# Altium footprint library lib_protel_HC.PCBLIB: 724 footprints (part 22 of 46)
Each footprint in its own frame and in the unit in brackets; x right, y up, seen from the top. Pads: shape width x height; smd on the part's side, far side on the other; paste and mask are expansions set on the pad; w line width, h text height; cw(c..) or ccw(c..) is an arc to the next point about the centre after c.
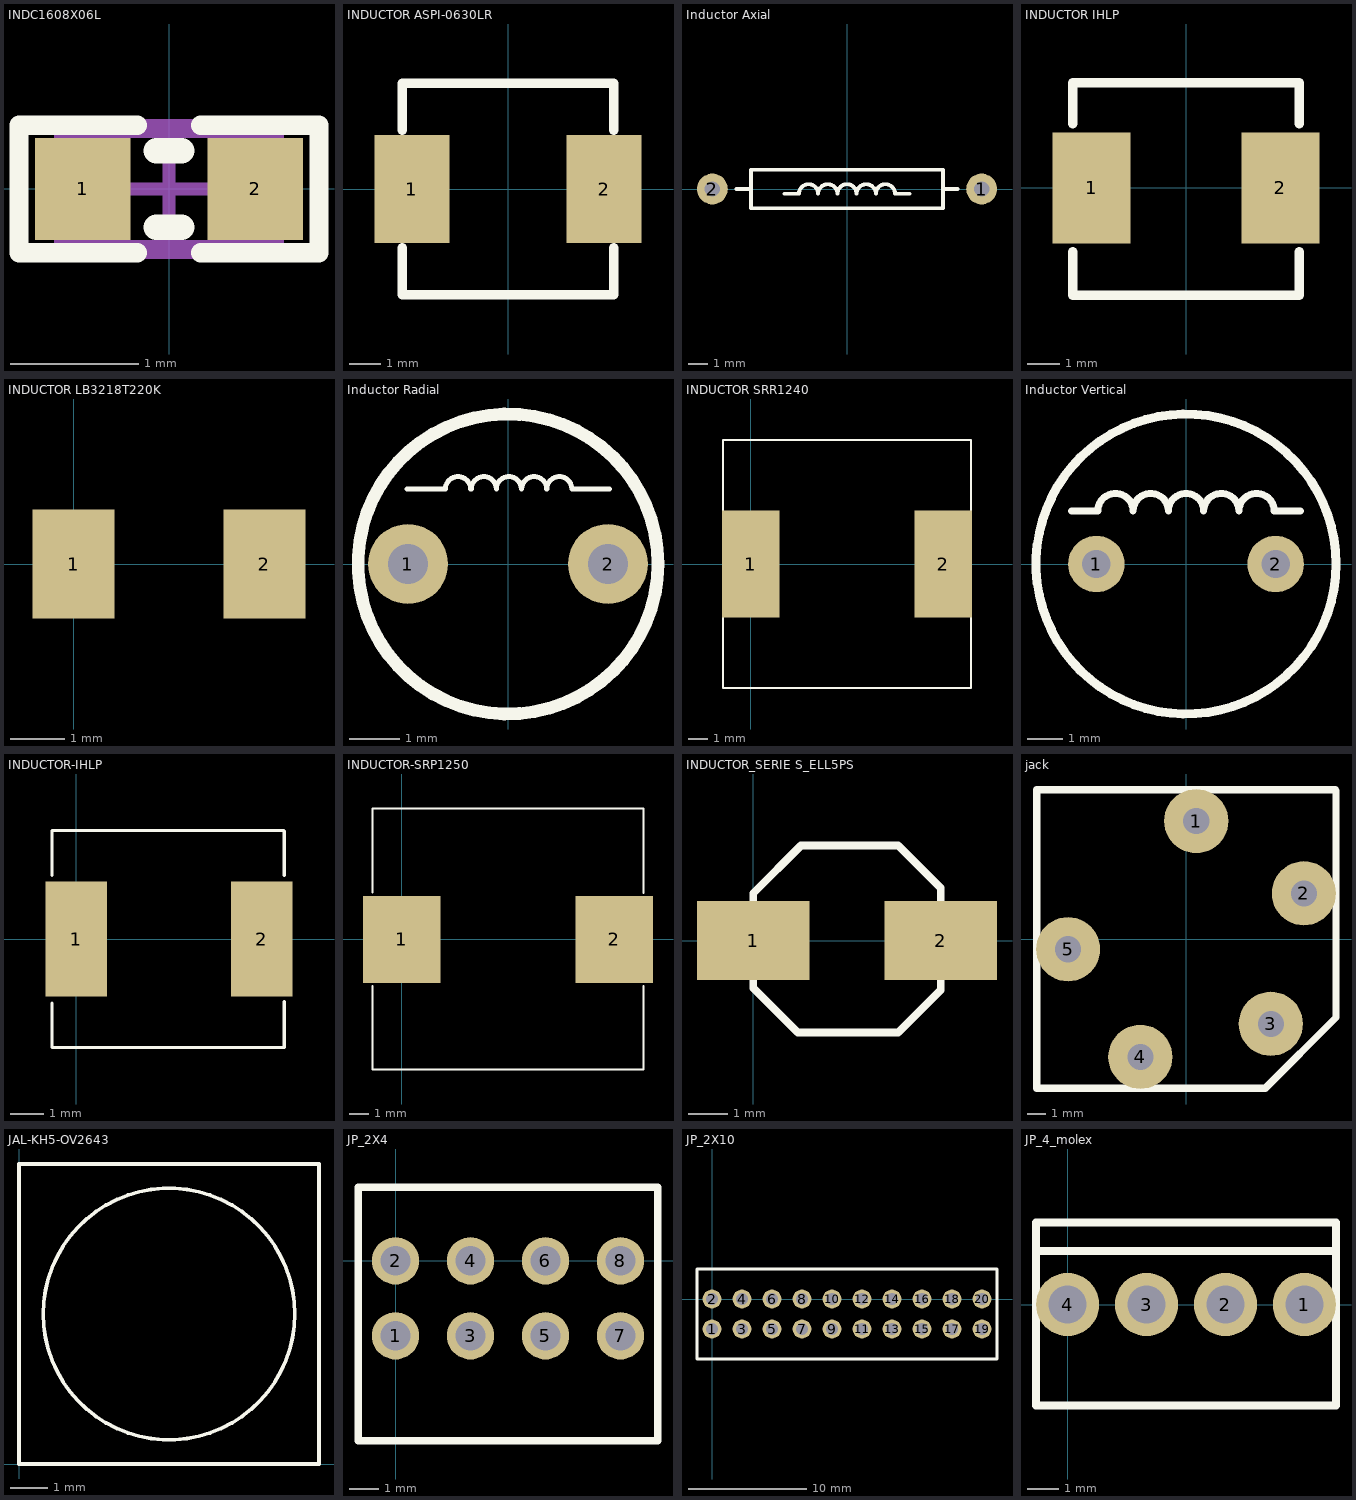
[diagram p21: the footprints below, top view; thin cyan lines are the x and y axes]

## INDC1608X06L [mm]
pads (2):
  rect 0.75x0.8 smd: 1(-0.675,0) 2(0.675,0)
Top Overlay:
  lines w0.152: -0.25,-0.5 -1.175,-0.5 -1.175,0.5 -0.25,0.5 ; 0.25,-0.5 1.175,-0.5 1.175,0.5 0.25,0.5
  lines w0.2: -0.1,-0.3 0.1,-0.3 ; -0.1,0.3 0.1,0.3
Mechanical 13:
  lines w0.1: -0.85,-0.45 0.85,-0.45 0.85,0.45 -0.85,0.45 -0.85,-0.45
Mechanical 15:
  lines w0.1: -0.45,0 0.45,0 ; 0,-0.45 0,0.45 ; -1.175,-0.5 -1.175,0.5 1.175,0.5 1.175,-0.5 -1.175,-0.5
3D body: height 0.8, standoff 0, extent -0.8,-0.475 0.8,0.475

## INDUCTOR ASPI-0630LR [mm]
height 3
pads (2):
  rect 2.35x3.4 smd: 1(-3.025,0) 2(3.025,0)
Top Overlay:
  lines w0.3: -3.325,-1.85 -3.325,-3.325 3.325,-3.325 3.325,-1.85 ; -3.325,1.85 -3.325,3.325 3.325,3.325 3.325,1.85
3D body "ASPI-0630LR.STEP": height 3, standoff 0, extent -3.6,-3.325 3.6,3.325

## Inductor Axial [mm]
pads (2):
  round 1.6 hole 0.8: 1(7,0) 2(-7,0)
Top Overlay:
  lines w0.2: -5.75,0 -5,0 ; -3.25,-0.25 -2.5,-0.25 cw(c-2,-0.25) -1.5,-0.25 cw(c-1,-0.25) -0.5,-0.25 cw(c0,-0.25) 0.5,-0.25 cw(c1,-0.25) 1.5,-0.25 cw(c2,-0.25) 2.5,-0.25 3.25,-0.25 ; 5,0 5.75,0 ; -5,-1 -5,1 5,1 5,-1 -5,-1

## INDUCTOR IHLP [mm] "IHLP-2525CZ-01"
pads (2):
  rect 2.41x3.43 smd: 1(-2.92,0) 2(2.92,0)
Top Overlay:
  lines w0.3: -3.5,-1.975 -3.5,-3.325 3.5,-3.325 3.5,-1.975 ; -3.5,1.975 -3.5,3.25 3.5,3.25 3.5,1.975
3D body "IHLP-2525CZ.STEP": height 3, standoff 0, extent -3.405,-3.295 3.455,3.175

## INDUCTOR LB3218T220K [mm] "LB3218T220K"
height 1.8
pads (2):
  rect 1.5x2 smd: 1(0,0) 2(3.5,0)

## Inductor Radial [mm] "Pin Power Inductor"
height 5
pads (2):
  round 1.6 hole 0.8: 1(-2,0) 2(2,0)
Top Overlay:
  circle w0.254: c0,0 r3
  lines w0.1: -2.022,1.5 -1.272,1.5 ; -1.25,1.5 cw(c-1,1.5) -0.75,1.5 ; -0.732,1.5 cw(c-0.482,1.5) -0.232,1.5 cw(c0.017,1.5) 0.267,1.5 ; 0.272,1.5 cw(c0.522,1.5) 0.772,1.5 ; 0.777,1.5 cw(c1.027,1.5) 1.277,1.5 ; 1.28,1.5 2.03,1.5
3D body "1.STEP": height 2.9, standoff 0, extent -3.407,-2.357 3.393,2.343

## INDUCTOR SRR1240 [mm] "INDUCTOR"
height 4
pads (2):
  rect 2.9x5.4 smd: 1(0,0) 2(9.7,0)
Top Overlay:
  lines w0.1: -1.4,-6.25 -1.4,0 -1.4,6.25 11.1,6.25 11.1,-6.25 -1.4,-6.25

## Inductor Vertical [mm]
pads (2):
  round 1.6 hole 0.8: 1(-2.54,0) 2(2.54,0)
Top Overlay:
  circle w0.254: c0,0 r4.25
  lines w0.2: -3.25,1.5 -2.5,1.5 cw(c-2,1.5) -1.5,1.5 cw(c-1,1.5) -0.5,1.5 cw(c0,1.5) 0.5,1.5 cw(c1,1.5) 1.5,1.5 cw(c2,1.5) 2.5,1.5 3.25,1.5

## INDUCTOR-IHLP [mm] "IHLP-2525CZ-01"
height 3
pads (2):
  rect 1.83x3.43 smd: 1(0,0) 2(5.55,0)
Top Overlay:
  lines w0.1: -0.725,-1.925 -0.725,-3.25 0,-3.25 5.55,-3.25 6.225,-3.25 6.225,-1.875 ; -0.725,1.9 -0.725,3.25 0,3.25 5.5,3.25 6.2,3.25 6.225,3.225 6.225,1.9

## INDUCTOR-SRP1250 [mm] "SRP1250-4R7M"
height 5.2
pads (2):
  rect 4x4.5 smd: 1(0,0) 2(11,0)
Top Overlay:
  lines w0.1: -1.5,-2.4 -1.5,-6.725 12.5,-6.725 12.5,-2.4 ; -1.5,2.425 -1.5,6.775 12.5,6.775 12.5,2.4

## INDUCTOR_SERIE S_ELL5PS [mm]
height 1.8
pads (2):
  rect 2.85x2 smd: 1(0,0) 2(4.75,0)
Top Overlay:
  lines w0.2: 0,-1.2 1.13,-2.33 3.67,-2.33 4.75,-1.25 4.75,1.33 3.67,2.41 1.21,2.41 0,1.2 0,-1.2

## jack [mil]
pads (5):
  round 137.8 hole 56: 1(22,253) 2(253,98) 3(182,-182) 4(-98,-253) 5(-253,-22)
Top Overlay:
  lines w15.75: 320,320 -320,320 -320,-320 170.16,-320 321.85,-168.31 321.85,318.15

## JAL-KH5-OV2643 [mm] "CAMARA OV"
height 4.7
Top Overlay:
  circle w0.1: c4,4 r3.355
  lines w0.1: 0,0 8,0 8,8 0,8 0,0

## JP_2X4 [mm]
height 10
pads (8):
  round 1.6 hole 1: 1(0,-2.54) 2(0,0) 3(2.54,-2.54) 4(2.54,0) 5(5.08,-2.54) 6(5.08,0) 7(7.62,-2.54) 8(7.62,0)
Top Overlay:
  lines w0.254: -1.27,-6.1 8.89,-6.1 8.89,2.5 -1.27,2.5 -1.27,-6.1

## JP_2X10 [mm] "PASO 2.54mm"
height 11.4
pads (20):
  round 1.6 hole 1: 1(0,-2.54) 2(0,0) 3(2.54,-2.54) 4(2.54,0) 5(5.08,-2.54) 6(5.08,0) 7(7.62,-2.54) 8(7.62,0) 9(10.16,-2.54) 10(10.16,0) 11(12.7,-2.54) 12(12.7,0) 13(15.24,-2.54) 14(15.24,0) 15(17.78,-2.54) 16(17.78,0) 17(20.32,-2.54) 18(20.32,0) 19(22.86,-2.54) 20(22.86,0)
Top Overlay:
  lines w0.254: -1.27,-5.08 -1.27,2.54 24.13,2.54 24.13,-5.08 -1.27,-5.08

## JP_4_molex [mm] "22-04-1041"
height 11.7
pads (4):
  round 2 hole 1.2: 1(7.5,0) 2(5,0) 3(2.5,0) 4(0,0)
Top Overlay:
  lines w0.254: -1,1.7 8.5,1.7 ; -1,-3.2 -1,2.6 8.5,2.6 8.5,-3.2 -1,-3.2